# Altium footprint library MercurialSDR.PcbLib: 74 footprints (part 5 of 5)
Each footprint in its own frame and in the unit in brackets; x right, y up, seen from the top. Pads: shape width x height; smd on the part's side, far side on the other; paste and mask are expansions set on the pad; w line width, h text height; cw(c..) or ccw(c..) is an arc to the next point about the centre after c.
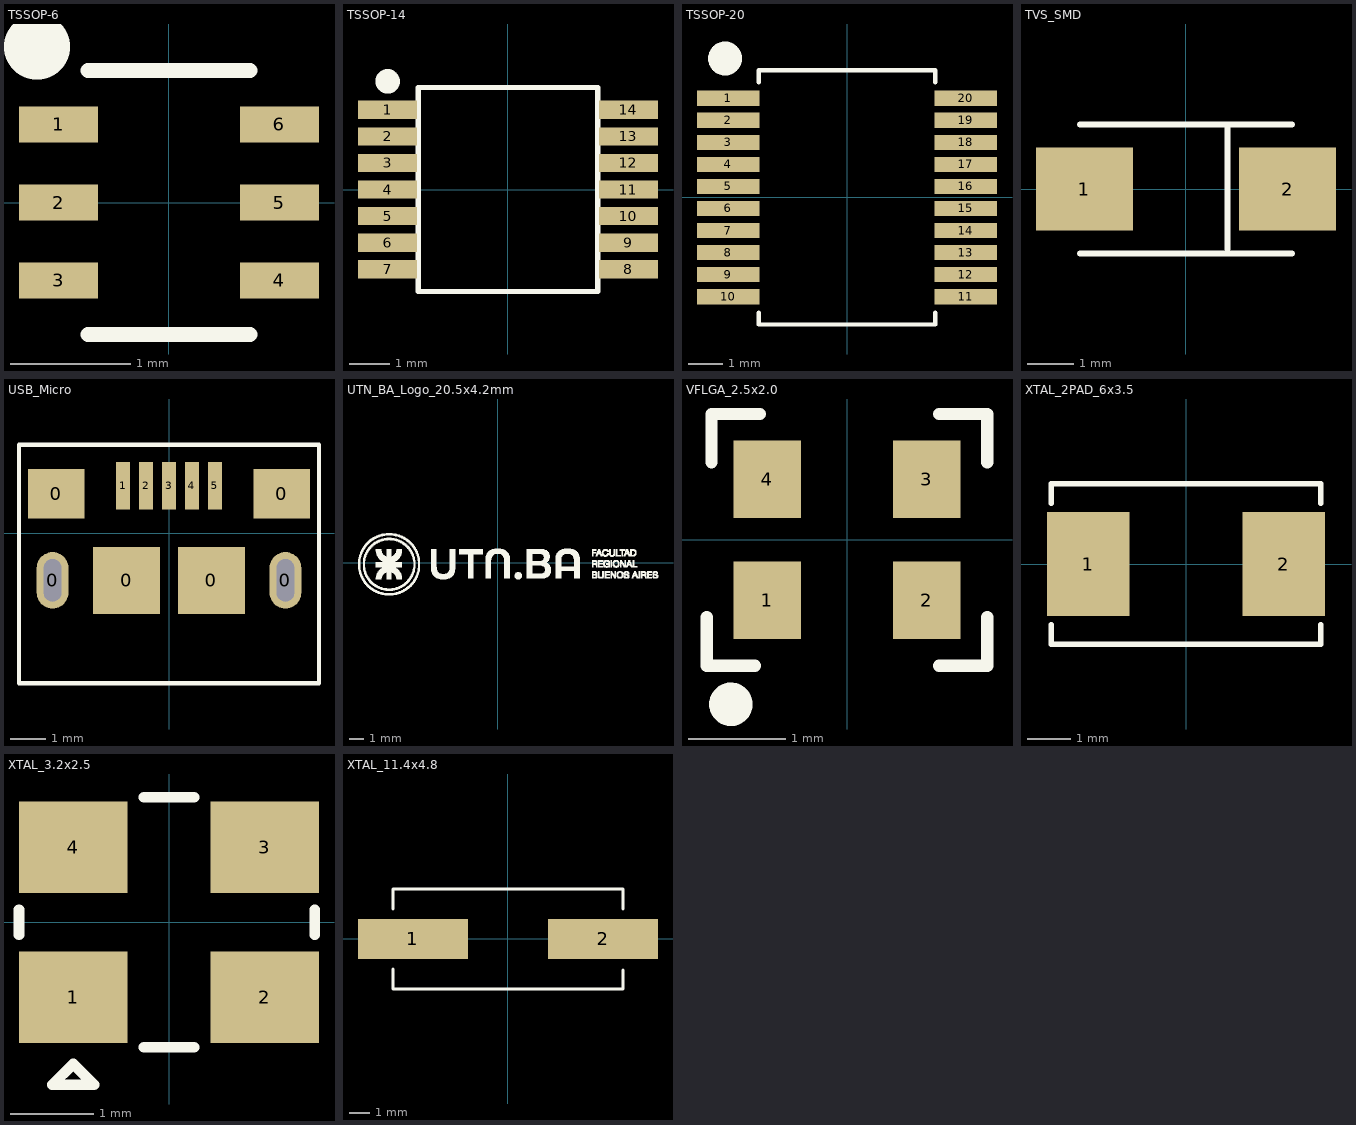
[diagram p4: the footprints below, top view; thin cyan lines are the x and y axes]

## TSSOP-6 [mm] "Array TBJ x2 TSSOP-6"
pads (6):
  rect 0.66x0.3 smd: 1(-0.92,0.65) 2(-0.92,0) 3(-0.92,-0.65) 4(0.92,-0.65) 5(0.92,0) 6(0.92,0.65)
Top Overlay:
  circle w0.5: c-1.1,1.3 r0.025
  lines w0.127: -0.675,-1.1 0.675,-1.1 ; -0.675,1.1 0.675,1.1
3D body "User Library-TSSOP-6 (SOT-23-6 PITCH 0_65).STEP": height 1.1, standoff -0.01, extent -1.145,-1.125 1.105,1.125

## TSSOP-14 [mm] "TSSOP de MCP6004"
pads (14):
  rect 1.45x0.45 smd: 1(-2.95,1.95) 2(-2.95,1.3) 3(-2.95,0.65) 4(-2.95,0) 5(-2.95,-0.65) 6(-2.95,-1.3) 7(-2.95,-1.95) 8(2.95,-1.95) 9(2.95,-1.3) 10(2.95,-0.65) 11(2.95,0) 12(2.95,0.65) 13(2.95,1.3) 14(2.95,1.95)
Top Overlay:
  circle w0.5: c-2.95,2.65 r0.05
  lines w0.127: -2.2,-2.5 2.2,-2.5 2.2,2.5 -2.2,2.5 -2.2,-2.5
3D body "User Library-TSSOP-14.STEP": height 1.2, standoff 0, extent -3.15,-2.5 3.25,2.5

## TSSOP-20 [mm] "ADC PCM1802 TSSOP20"
pads (20):
  rect 1.85x0.45 smd: 1(-3.5,2.925) 2(-3.5,2.275) 3(-3.5,1.625) 4(-3.5,0.975) 5(-3.5,0.325) 6(-3.5,-0.325) 7(-3.5,-0.975) 8(-3.5,-1.625) 9(-3.5,-2.275) 10(-3.5,-2.925) 11(3.5,-2.925) 12(3.5,-2.275) 13(3.5,-1.625) 14(3.5,-0.975) 15(3.5,-0.325) 16(3.5,0.325) 17(3.5,0.975) 18(3.5,1.625) 19(3.5,2.275) 20(3.5,2.925)
Top Overlay:
  circle w0.5: c-3.6,4.1 r0.25
  lines w0.127: -2.6,-3.4 -2.6,-3.75 2.6,-3.75 2.6,-3.4 ; -2.6,3.4 -2.6,3.75 2.6,3.75 2.6,3.4
3D body "User Library-TSSOP20_TP.STEP": height 1.1, standoff -0.09, extent -3.18,-3.35 3.1,3.15

## TVS_SMD [mm] "TVS SMD"
pads (2):
  rect 2.1x1.8 smd: 1(-2.2,0) 2(2.2,0)
Top Overlay:
  lines w0.127: -2.3,-1.4 2.3,-1.4 ; -2.3,1.4 2.3,1.4 ; 0.9,-1.3 0.9,1.4
3D body "User Library-TVS-DO-214AC(SMA).step": height 1.14, standoff -1.14, extent -2.643,-1.397 2.843,1.397

## USB_Micro [mm] "Conector microUSB"
pads (11):
  oval 0.9x1.6 hole 0.5 slot 1.2 at 90 deg unplated: 0(-3.3,-1.338) 0(3.3,-1.338)
  rect 1.6x1.4 smd: 0(-3.2,1.112) 0(3.2,1.112)
  rect 1.9x1.9 smd: 0(-1.2,-1.338) 0(1.2,-1.338)
  rect 0.4x1.35 smd: 1(-1.3,1.338) 2(-0.65,1.338) 3(0,1.338) 4(0.65,1.338) 5(1.3,1.338)
Top Overlay:
  lines w0.127: -4.25,-4.25 4.25,-4.25 4.25,2.5 -4.25,2.5 -4.25,-4.25
3D body "User Library-mico_usb.step": height 3.18, standoff -0.42, extent -3.928,-4.041 3.928,1.62

## UTN_BA_Logo_20.5x4.2mm [mm]
Top Overlay:
  drawing of 2371 lines, arcs and shapes, not listed

## VFLGA_2.5x2.0 [mm]
pads (4):
  rect 0.7x0.8 smd: 1(-0.825,-0.625) 2(0.825,-0.625) 3(0.825,0.625) 4(-0.825,0.625)
Top Overlay:
  circle w0.25: c-1.2,-1.7 r0.1
  lines w0.127: -1.45,-0.8 -1.45,-1.3 -0.95,-1.3 ; -1.4,0.8 -1.4,1.3 -0.9,1.3 ; 0.95,-1.3 1.45,-1.3 1.45,-0.8 ; 0.95,1.3 1.45,1.3 1.45,0.8
3D body "DSC6013JI2A-016.0000.stp": height 0.99, standoff 0, extent -1.25,-1 1.25,1

## XTAL_2PAD_6x3.5 [mm] "Cristal de dos conectores 6x3.5"
pads (2):
  rect 1.9x2.4 smd: 1(-2.25,0) 2(2.25,0)
Top Overlay:
  lines w0.127: -3.1,-1.4 -3.1,-1.85 3.1,-1.85 3.1,-1.4 ; -3.1,1.4 -3.1,1.85 3.1,1.85 3.1,1.4
3D body "User Library-Xtal-ABM7.STEP": height 1.54, standoff 0.14, extent -3.1,-1.85 3.1,1.85

## XTAL_3.2x2.5 [mm]
pads (4):
  rect 1.3x1.1 smd: 1(-1.15,-0.9) 2(1.15,-0.9) 3(1.15,0.9) 4(-1.15,0.9)
Top Overlay:
  lines w0.127: -1.8,-0.15 -1.8,0.15 ; -0.3,-1.5 0.3,-1.5 ; -0.3,1.5 0.3,1.5 ; 1.75,-0.15 1.75,0.15 ; -1.15,-1.7 -1.15,-1.7 ; -1.15,-1.7 -1.4,-1.95 -0.9,-1.95 -1.15,-1.7
3D body "ABM8AIG-16.000MHZ-4-T.stp": height 0.9, standoff 0, extent -1.69,-1.39 1.69,1.39

## XTAL_11.4x4.8 [mm] "Oscilador a cristal"
pads (2):
  rect 5.5x2 smd: 1(-4.75,0) 2(4.75,0)
Top Overlay:
  lines w0.127: -5.75,-1.5 -5.75,-2.5 5.75,-2.5 5.75,-1.55 ; -5.75,1.5 -5.75,2.5 5.75,2.5 5.75,1.5
3D body "Xtal_ECS-040-18-5PX-JES-TR.stp": height 4.4, standoff 0, extent -7.35,-2.4 7.25,2.4